# Altium footprint library TriggersLib.PcbLib: 262 footprints (part 14 of 17)
Each footprint in its own frame and in the unit in brackets; x right, y up, seen from the top. Pads: shape width x height; smd on the part's side, far side on the other; paste and mask are expansions set on the pad; w line width, h text height; cw(c..) or ccw(c..) is an arc to the next point about the centre after c.
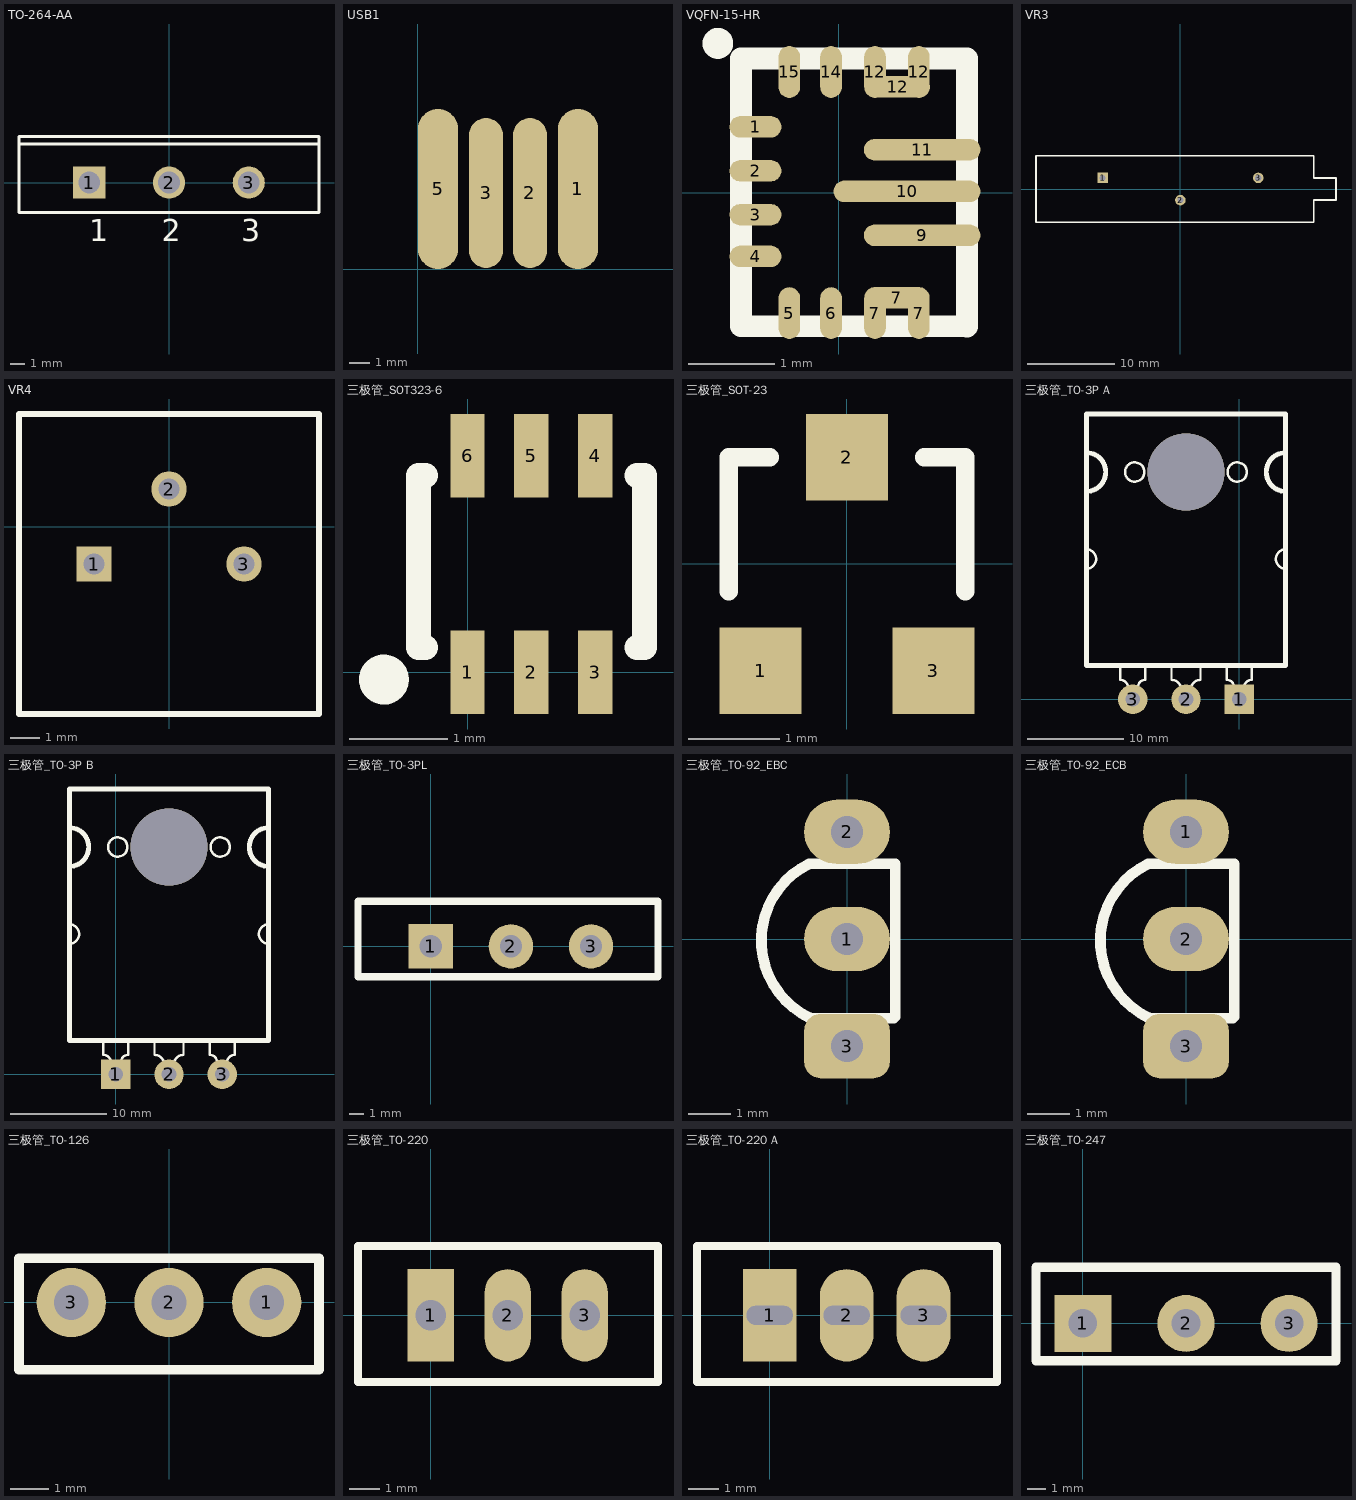
[diagram p13: the footprints below, top view; thin cyan lines are the x and y axes]

## TO-264-AA [mm] "SIP with Mounting Hole; 3 Leads; Body 26 x 20 x 5 mm (typ); Pitch 5.45 mm"
height 29
pads (3):
  rect 2.2x2.2 hole 1.5: 1(-5.45,0)
  round 2.2 hole 1.5: 2(0,0) 3(5.45,0)
Top Overlay:
  lines w0.2: -10.25,2.65 10.25,2.65 ; -10.25,-2.05 10.25,-2.05 10.25,3.15 -10.25,3.15 -10.25,-2.05
  text "1" at -5.45,-4.025 h1.5
  text "2" at -0.508,-4.025 h1.5
  text "3" at 4.942,-4.025 h1.5
3D body "to264.STEP": height 34, standoff -5, extent -10.025,-2.712 9.975,2.388

## USB1 [mm]
pads (4):
  oval 2x8 smd: 1(8,4) 5(1,4)
  oval 1.7x7.5 smd: 2(5.6,3.8) 3(3.4,3.8)

## VQFN-15-HR [mm] "VQFN"
pads (17):
  oval 0.599x0.25 smd: 1(-0.964,0.759) 2(-0.964,0.251) 3(-0.964,-0.257) 4(-0.964,-0.739)
  oval 0.25x0.599 smd: 5(-0.573,-1.394) 6(-0.09,-1.394) 7(0.418,-1.394) 7(0.926,-1.394) 12(0.418,1.394) 12(0.926,1.394) 14(-0.09,1.394) 15(-0.573,1.394)
  oval 0.75x0.25 smd: 7(0.672,-1.217) 12(0.679,1.222)
  oval 1.349x0.25 smd: 9(0.964,-0.495) 11(0.964,0.495)
  oval 1.7x0.25 smd: 10(0.789,0.013)
Top Overlay:
  circle w0.254: c-1.399,1.725 r0.051
  lines w0.254: -1.132,1.553 -1.132,-1.547 1.468,-1.547 ; -1.115,1.552 1.485,1.552 1.485,-1.548

## VR3 [mm] "Tapped Resistor; 3 Leads"
pads (3):
  rect 1.2x1.2 hole 0.7: 1(-8.89,1.27)
  round 1.2 hole 0.7: 2(0,-1.27) 3(8.89,1.27)
Top Overlay:
  lines w0.2: -16.51,-3.81 -16.51,3.81 15.24,3.81 15.24,1.27 17.78,1.27 17.78,-1.27 15.24,-1.27 15.24,-3.81 -16.51,-3.81
3D body "vr3.STEP": height 10, standoff 0, extent -16.576,-3.556 16.424,3.544

## VR4 [mm] "Feed-Through Capacitor; 3 Leads"
pads (3):
  rect 1.2x1.2 hole 0.7: 1(-2.54,-1.27)
  round 1.2 hole 0.7: 2(0,1.27) 3(2.54,-1.27)
Top Overlay:
  lines w0.2: -5.08,-6.35 -5.08,3.81 2.54,3.81 5.08,3.81 5.08,-6.35 -5.08,-6.35
3D body "vr4.STEP": height 6, standoff 0, extent -5.022,-6.321 4.978,3.679

## 三极管_SOT323-6 [mm]
pads (6):
  rect 0.35x0.85 smd: 1(0,0) 2(0.65,0) 3(1.3,0) 4(1.3,2.2) 5(0.65,2.2) 6(0,2.2)
Top Overlay:
  circle w0.254: c-0.85,-0.075 r0.127
  lines w0.254: -0.425,0.25 -0.5,0.25 -0.5,2 -0.425,2 ; 1.725,0.25 1.8,0.25 1.8,2 1.725,2

## 三极管_SOT-23 [mm]
pads (3):
  rect 0.9x0.95 smd: 1(-0.95,-1.175) 2(0,1.175) 3(0.95,-1.175)
Top Overlay:
  lines w0.2: -1.3,-0.3 -1.3,1.175 -0.85,1.175 ; 0.85,1.175 1.3,1.175 1.3,-0.3
3D body "SOT-23-3.STEP": height 1.2, standoff 0, extent -1.45,-1.4 1.45,1.4

## 三极管_TO-3P A [mil]
pads (3):
  rect 120x120 hole 60: 1(0,0)
  round 120 hole 60: 2(-216.54,0) 3(-433.07,0)
via -216.54,925.2 diameter 314.96 hole 314.96
Top Overlay:
  circle w10: c-7.87,925.2 r39.37
  circle w10: c-425.2,925.2 r39.37
  lines w10: -622.05,531.5 ccw(c-622.05,570.87) -622.05,610.24 ; -484.25,137.8 -484.25,78.74 cw(c-484.25,47.24) -452.76,47.24 -452.76,0 -413.39,0 -413.39,47.24 cw(c-381.89,47.24) -381.89,78.74 -381.89,137.8 ; -275.59,137.8 -275.59,78.74 cw(c-275.59,39.37) -236.22,39.37 -236.22,0 -196.85,0 -196.85,39.37 cw(c-157.48,39.37) -157.48,78.74 -157.48,137.8 ; -51.18,137.8 -51.18,78.74 cw(c-51.18,47.24) -19.69,47.24 -19.69,0 19.68,0 19.68,47.24 cw(c51.18,47.24) 51.18,78.74 51.18,137.8 ; 188.98,531.5 cw(c188.98,570.87) 188.98,610.24
  lines w20: -622.05,846.46 ccw(c-622.05,925.2) -622.05,1003.94 ; 188.98,846.46 cw(c188.98,925.2) 188.98,1003.94 ; -622.05,137.8 188.98,137.8 188.98,1161.42 -622.05,1161.42 -622.05,137.8

## 三极管_TO-3P B [mil]
pads (3):
  rect 120x120 hole 60: 1(0,0)
  round 120 hole 60: 2(216.54,0) 3(433.07,0)
via 216.54,925.2 diameter 314.96 hole 314.96
Top Overlay:
  circle w10: c425.2,925.2 r39.37
  circle w10: c7.87,925.2 r39.37
  lines w10: -188.98,531.5 ccw(c-188.98,570.87) -188.98,610.24 ; -51.18,137.8 -51.18,78.74 cw(c-51.18,47.24) -19.69,47.24 -19.69,0 19.68,0 19.68,47.24 cw(c51.18,47.24) 51.18,78.74 51.18,137.8 ; 157.48,137.8 157.48,78.74 cw(c157.48,39.37) 196.85,39.37 196.85,0 236.22,0 236.22,39.37 cw(c275.59,39.37) 275.59,78.74 275.59,137.8 ; 381.89,137.8 381.89,78.74 cw(c381.89,47.24) 413.39,47.24 413.39,0 452.76,0 452.76,47.24 cw(c484.25,47.24) 484.25,78.74 484.25,137.8 ; 622.05,531.5 cw(c622.05,570.87) 622.05,610.24
  lines w20: -188.98,846.46 ccw(c-188.98,925.2) -188.98,1003.94 ; 622.05,846.46 cw(c622.05,925.2) 622.05,1003.94 ; -188.98,137.8 622.05,137.8 622.05,1161.42 -188.98,1161.42 -188.98,137.8

## 三极管_TO-3PL [mil]
pads (3):
  rect 120x120 hole 60: 1(0,0)
  round 120 hole 60: 2(216.54,0) 3(433.07,0)
Top Overlay:
  lines w19.68: -196.85,-82.68 -196.85,122.05 614.17,122.05 614.17,-82.68 -196.85,-82.68

## 三极管_TO-92_EBC [mil]
pads (3):
  oval 80x60 hole 30: 1(0,0) 2(0,100)
  rrect50% 80x60 hole 30: 3(0,-100)
Top Overlay:
  lines w9.84: -35.15,70.31 44.69,70.31 ; -34.43,-73.8 43.8,-73.8 45,-72.61 45,70
  lines w10: -35.15,70.31 ccw(c0,-1.57) -34.43,-73.8

## 三极管_TO-92_ECB [mil]
pads (3):
  oval 80x60 hole 30: 1(0,100) 2(0,0)
  rrect50% 80x60 hole 30: 3(0,-100)
Top Overlay:
  lines w9.84: -35.15,70.31 44.69,70.31 ; -34.43,-73.8 43.8,-73.8 45,-72.61 45,70
  lines w10: -35.15,70.31 ccw(c0,-1.57) -34.43,-73.8

## 三极管_TO-126 [mm]
pads (3):
  round 1.8 hole 0.9: 1(2.54,0) 2(0,0) 3(-2.54,0)
Top Overlay:
  lines w0.254: -3.9,-1.75 3.9,-1.75 3.9,1.15 -3.9,1.15 -3.9,-1.75

## 三极管_TO-220 [mil]
pads (3):
  rect 60x120 hole 40: 1(0,0)
  oval 60x120 hole 40: 2(100,0) 3(200,0)
Top Overlay:
  lines w10: -94.49,-86.61 295.28,-86.61 295.28,90 -94.49,90 -94.49,-86.61
3D body "User Library-TO-220-1.step": height 760.24, standoff -372.83, extent -94.88,-87.16 294.88,90

## 三极管_TO-220 A [mil]
pads (3):
  rect 70x120 hole 25 slot 60 at 0 deg: 1(0,0)
  oval 70x120 hole 25 slot 60 at 0 deg: 2(100,0) 3(200,0)
Top Overlay:
  lines w10: -94.49,-86.61 295.28,-86.61 295.28,90 -94.49,90 -94.49,-86.61
3D body "User Library-TO-220-1.step": height 630.24, standoff -502.83, extent -94.88,-87.16 294.88,90

## 三极管_TO-247 [mil]
pads (3):
  rect 120x120 hole 60: 1(0,0)
  round 120 hole 60: 2(216.54,0) 3(433.07,0)
Top Overlay:
  lines w19.68: -98.43,-78.74 -98.43,118.11 531.5,118.11 531.5,-78.74 -98.43,-78.74